# Altium footprint library my_lib.PcbLib: 121 footprints (part 7 of 8)
Each footprint in its own frame and in the unit in brackets; x right, y up, seen from the top. Pads: shape width x height; smd on the part's side, far side on the other; paste and mask are expansions set on the pad; w line width, h text height; cw(c..) or ccw(c..) is an arc to the next point about the centre after c.
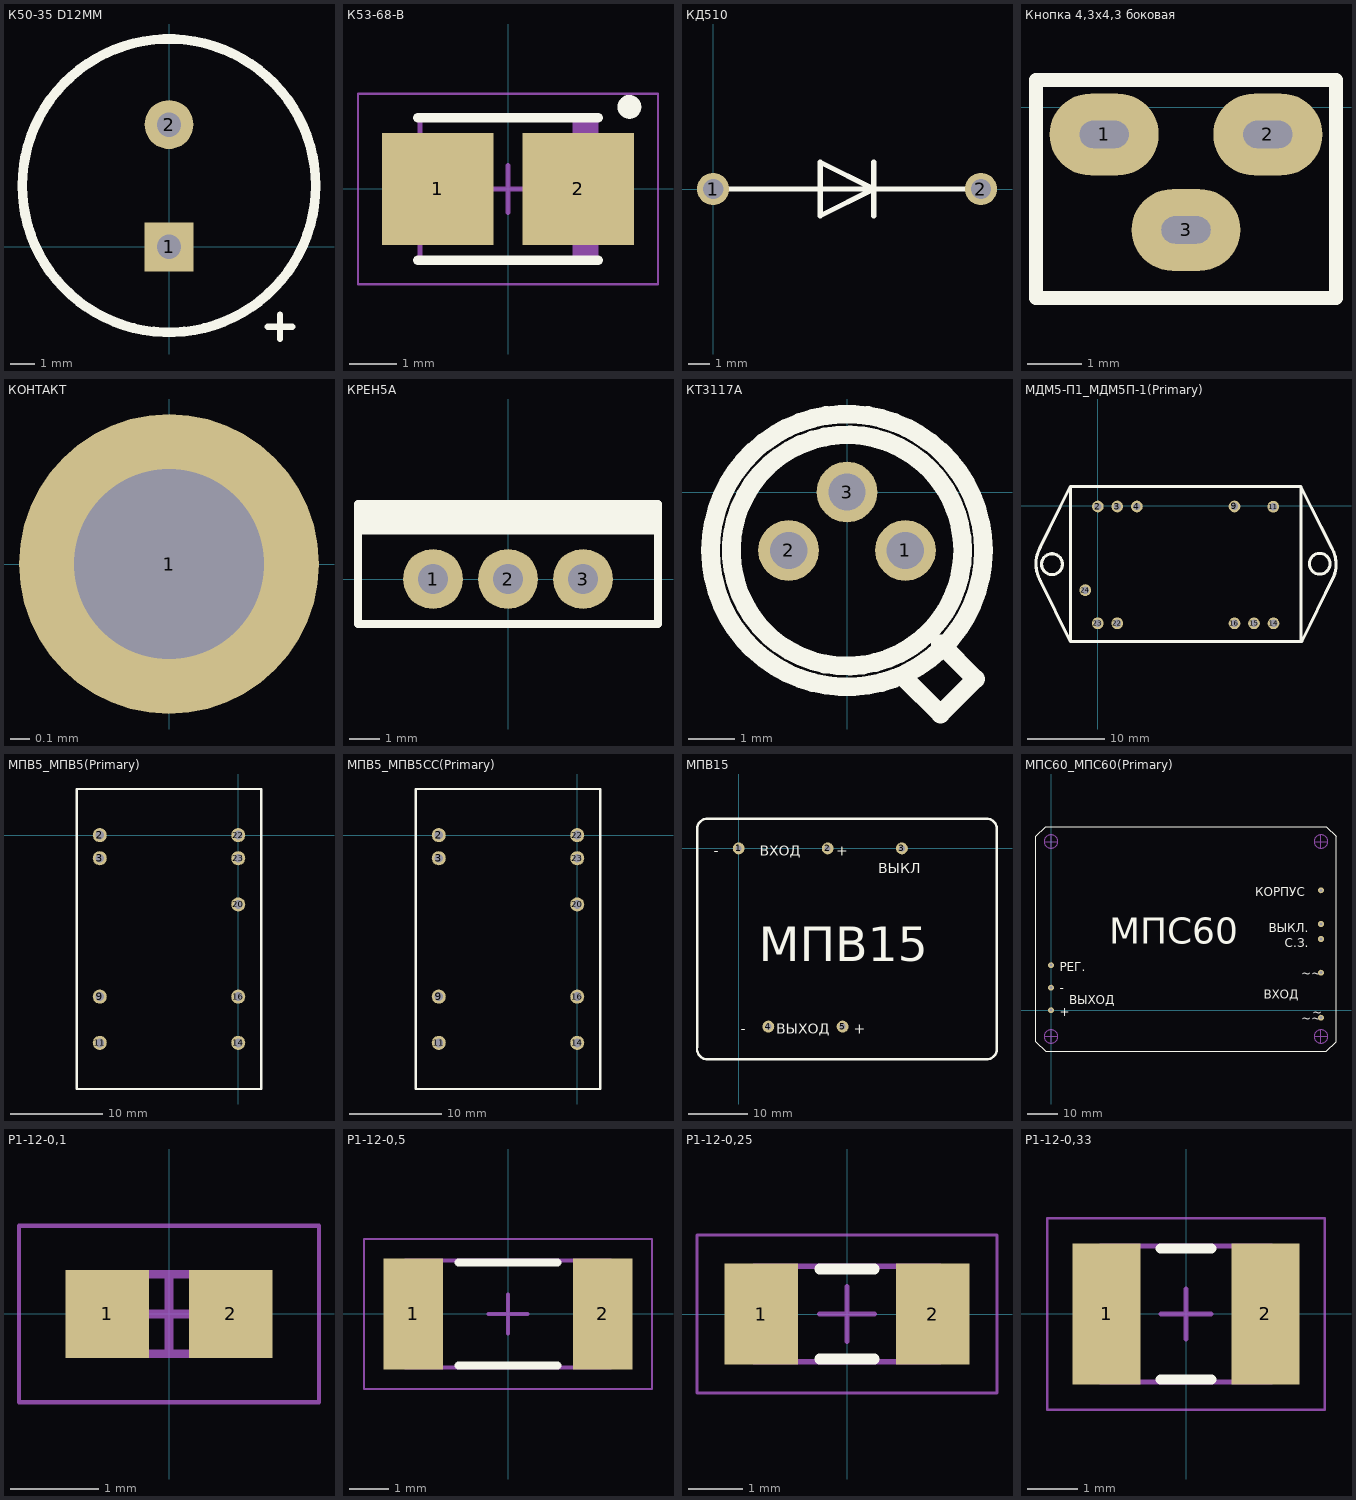
[diagram p6: the footprints below, top view; thin cyan lines are the x and y axes]

## К50-35 D12MM [mm]
pads (2):
  rect 2x2 hole 1: 1(0,0)
  round 2 hole 1: 2(0,5)
Top Overlay:
  lines w0.25: 4.04,-3.27 5.04,-3.27 ; 4.54,-3.77 4.54,-2.77
  lines w0.4: -6,2.5 ccw(c0,2.5) 6,2.5 ccw(c0,2.5) -6,2.5

## К53-68-B [mm] "Molded Capacitor, 2-Leads, Body 3,50x2,80mm, IPC Low Density"
height 2.1
pads (2):
  rect 2.35x2.35 smd: 1(-1.475,0) 2(1.475,0)
Top Overlay:
  circle w0.25: c2.55,1.725 r0.125
  lines w0.2: -1.9,-1.5 1.9,-1.5 ; -1.9,1.5 1.9,1.5
Mechanical 13:
  rectangle: 1.352,-1.5 1.85,1.5
  lines w0.1: -1.85,-1.5 1.85,-1.5 1.85,1.5 -1.85,1.5 -1.85,-1.5
Mechanical 15:
  lines w0.05: -3.15,-2 3.15,-2 3.15,2 -3.15,2 -3.15,-2
  lines w0.1: -0.5,0 0.5,0 ; 0,-0.5 0,0.5
3D body: height 2.1, standoff 0, extent -1.85,-1.5 1.85,1.5

## КД510 [mil]
pads (2):
  round 60 hole 38: 1(0,0) 2(500,0)
Top Overlay:
  lines w10: 0,0 500,0 ; 300,-50 300,50 ; 200,-50 300,0 200,50 200,-50

## Кнопка 4,3х4,3 боковая [mm]
pads (3):
  oval 2x1.5 hole 0.5 slot 0.9 at 0 deg: 1(2,-0.5) 2(5,-0.5) 3(3.5,-2.25)
Top Overlay:
  lines w0.254: 0.75,-3.5 6.25,-3.5 6.25,0.5 0.75,0.5 0.75,-3.5
3D body "E-type 3-Pin 4.5x4.5 Tact Switch TS45HE.STEP": height 4.75, standoff -1.75, extent 1.25,-4.5 5.75,0.5

## КОНТАКТ [mil]
pads (1):
  round 60 hole 38: 1(0,0)

## КРЕН5А [mm]
pads (3):
  round 2 hole 1: 1(-2.5,0) 2(0,0) 3(2.5,0)
Top Overlay:
  region: -5,2.5 -5,1.5 5,1.5 5,2.5
  lines w0.254: -5,-1.5 -5,2.5 5,2.5 5,-1.5 -5,-1.5

## КТ3117А [mm]
pads (3):
  round 1.3 hole 0.8: 1(1.25,-1.25) 2(-1.25,-1.25) 3(0,0)
Top Overlay:
  circle w0.4: c0,-1.25 r2.475
  circle w0.4: c0,-1.25 r2.92
  lines w0.4: 1.25,-4 2,-4.75 2.75,-4 2,-3.25

## МДМ5-П1_МДМ5П-1(Primary) [mil]
pads (11):
  round 60 hole 38: 2(-0.79,-2.76) 3(98.82,-2.76) 4(199.21,-2.76) 9(698.82,-2.36) 11(897.64,-3.54) 14(898.82,-600.79) 15(798.82,-600.79) 16(698.82,-600.79) 22(98.82,-600.79) 23(-1.18,-600.79) 24(-64.96,-430.71)
Top Overlay:
  lines w15.75: -298.82,-219.29 -141.73,100.79 ; -295.67,-381.5 -141.73,-693.7 ; -295.67,-212.99 ccw(c-143.63,-297.23) -294.09,-384.25 ; -288.78,-298.03 ccw(c-235.63,-298.03) -182.48,-298.03 ; -288.78,-297.64 cw(c-235.63,-297.64) -182.48,-297.64 ; -141.73,-694.49 -141.73,100.79 ; -141.34,-694.49 1039.37,-694.49 ; 1038.58,98.82 1195.28,-212.2 ; 1038.98,-694.88 1038.98,100.39 ; 1039.37,100.79 -141.73,100.79 ; 1043.31,-694.88 1203.54,-367.72 ; 1082.09,-296.06 ccw(c1135.24,-296.06) 1188.39,-296.06 ; 1082.09,-295.67 cw(c1135.24,-295.67) 1188.39,-295.67 ; 1195.28,-211.02 cw(c1044.81,-298.04) 1196.85,-382.28

## МПВ5_МПВ5(Primary) [mil]
pads (9):
  round 60 hole 38: 2(-590.55,0) 3(-590.55,-98.43) 9(-590.55,-688.98) 11(-590.55,-885.83) 14(0,-885.83) 16(0,-688.98) 20(0,-295.28) 22(0,0) 23(0,-98.43)
Top Overlay:
  lines w10: -688.98,-1082.68 -688.98,196.85 98.43,196.85 98.43,-1082.68 -688.98,-1082.68

## МПВ5_МПВ5СС(Primary) [mil]
pads (9):
  round 60 hole 38: 2(-590.55,0) 3(-590.55,-98.43) 9(-590.55,-688.98) 11(-590.55,-885.83) 14(0,-885.83) 16(0,-688.98) 20(0,-295.28) 22(0,0) 23(0,-98.43)
Top Overlay:
  lines w10: -688.98,-1082.68 -688.98,196.85 98.43,196.85 98.43,-1082.68 -688.98,-1082.68

## МПВ15 [mm]
pads (5):
  round 2 hole 1: 1(0,0) 2(15,0) 3(27.5,0) 4(5,-30) 5(17.5,-30)
Top Overlay:
  lines w0.4: -7.007,3.444 cw(c-5.25,3.25) -5.001,5 ; -7,-33.501 ccw(c-5.25,-33.75) -5.444,-35.507 ; -7,-33.5 -7,3.5 ; -5.5,-35.5 42,-35.5 ; -5,5 42,5 ; 41.501,-35.5 ccw(c41.75,-33.75) 43.507,-33.944 ; 41.944,5.007 cw(c41.75,3.25) 43.5,3.001 ; 43.5,-34 43.5,3.5
  text "-" at 0.322,-31.781 h3
  text "-" at -4.178,-1.781 h3
  text "+" at 19.425,-31.781 h3
  text "ВЫХОД" at 6.324,-31.781 h3
  text "+" at 16.425,-1.781 h3
  text "ВХОД" at 3.515,-1.781 h3
  text "ВЫКЛ" at 23.515,-4.781 h3
  text "МПВ15" at 3.378,-20.938 h10

## МПС60_МПС60(Primary) [mm]
pads (8):
  round 2 hole 1: 0(0,0) 1(0,7.5) 2(0,15) 3(90,-2.5) 4(90,12.5) 5(90,28.75) 6(90,23.75) 7(90,40)
Top Overlay:
  lines w0.4: -5,-10.5 -5,58 -1.75,61.25 91.75,61.25 95,58 95,-10.5 91.75,-13.75 -1.75,-13.75 -5,-10.5
  text "МПС60" at 19.473,19.094 h15
  text "ВЫКЛ." at 72.58,25.068 h4.94
  text "КОРПУС" at 68.082,37.068 h4.94
  text "ВХОД" at 70.903,2.818 h4.94
  text "ВЫХОД" at 6,1.068 h4.94
  text "С.З." at 77.872,20.068 h4.94
  text "~~" at 83.428,-4.932 h4.94
  text "~~" at 83.428,10.068 h4.94
  text "РЕГ." at 3,12.068 h4.94
  text "~" at 87,-2.963 h4.94
  text "-" at 3,5.068 h4.94
  text "+" at 3,-2.932 h4.94
Mechanical 1:
  lines w0.4: 0,-11 0,-6.5 ; 0,54 0,58.5 ; 90,-11 90,-6.5 ; 90,54 90,58.5 ; -2.25,-8.75 cw(c0,-8.75) 2.25,-8.75 ; -2.25,-8.75 ccw(c0,-8.75) 2.25,-8.75 ; -2.25,-8.75 2.25,-8.75 ; -2.25,56.25 cw(c0,56.25) 2.25,56.25 ; -2.25,56.25 ccw(c0,56.25) 2.25,56.25 ; -2.25,56.25 2.25,56.25 ; 87.75,-8.75 cw(c90,-8.75) 92.25,-8.75 ; 87.75,-8.75 ccw(c90,-8.75) 92.25,-8.75 ; 87.75,-8.75 92.25,-8.75 ; 87.75,56.25 cw(c90,56.25) 92.25,56.25 ; 87.75,56.25 ccw(c90,56.25) 92.25,56.25 ; 87.75,56.25 92.25,56.25

## Р1-12-0,1 [mm] "Chip Resistor, 2-Leads, Body 1,60x0,80mm, IPC Low Density"
height 0.55
pads (2):
  rect 0.95x1 smd: 1(-0.7,0) 2(0.7,0)
Mechanical 13:
  lines w0.1: -0.875,-0.45 0.875,-0.45 0.875,0.45 -0.875,0.45 -0.875,-0.45
Mechanical 15:
  lines w0.05: -1.7,-1 1.7,-1 1.7,1 -1.7,1 -1.7,-1
  lines w0.1: -0.45,0 0.45,0 ; 0,-0.45 0,0.45
3D body: height 0.55, standoff 0, extent 0.575,-0.45 0.875,0.45
3D body: height 0.55, standoff 0, extent -0.875,-0.45 -0.575,0.45
3D body: height 0.55, standoff 0, extent -0.575,-0.45 0.575,0.45

## Р1-12-0,5 [mm] "Chip Resistor, 2-Leads, Body 5,00x2,50mm, IPC Low Density"
height 0.8
pads (2):
  rect 1.5x2.8 smd: 1(-2.4,0) 2(2.4,0)
Top Overlay:
  lines w0.2: -1.25,-1.3 1.25,-1.3 ; -1.25,1.3 1.25,1.3
Mechanical 13:
  lines w0.1: -2.6,-1.35 -2.6,1.35 2.6,1.35 2.6,-1.35 -2.6,-1.35
Mechanical 15:
  lines w0.05: -3.65,-1.9 -3.65,1.9 3.65,1.9 3.65,-1.9 -3.65,-1.9
  lines w0.1: -0.5,0 0.5,0 ; 0,-0.5 0,0.5
3D body: height 0.8, standoff 0, extent -2.1,-1.35 2.1,1.35
3D body: height 0.8, standoff 0, extent -2.6,-1.35 -2.1,1.35
3D body: height 0.8, standoff 0, extent 2.1,-1.35 2.6,1.35

## Р1-12-0,25 [mm] "Chip Resistor, 2-Leads, Body 3,20x1,60mm, IPC Low Density"
height 0.8
pads (2):
  rect 1.35x1.85 smd: 1(-1.575,0) 2(1.575,0)
Top Overlay:
  lines w0.2: -0.5,-0.825 0.5,-0.825 ; -0.5,0.825 0.5,0.825
Mechanical 13:
  lines w0.1: -1.7,-0.875 -1.7,0.875 1.7,0.875 1.7,-0.875 -1.7,-0.875
Mechanical 15:
  lines w0.05: -2.75,-1.45 -2.75,1.45 2.75,1.45 2.75,-1.45 -2.75,-1.45
  lines w0.1: -0.5,0 0.5,0 ; 0,-0.5 0,0.5
3D body: height 0.8, standoff 0, extent -1.3,-0.875 1.3,0.875
3D body: height 0.8, standoff 0, extent -1.7,-0.875 -1.3,0.875
3D body: height 0.8, standoff 0, extent 1.3,-0.875 1.7,0.875

## Р1-12-0,33 [mm] "Chip Resistor, 2-Leads, Body 3,20x2,45mm, IPC Low Density"
height 0.8
pads (2):
  rect 1.35x2.8 smd: 1(-1.575,0) 2(1.575,0)
Top Overlay:
  lines w0.2: -0.5,-1.3 0.5,-1.3 ; -0.5,1.3 0.5,1.3
Mechanical 13:
  lines w0.1: -1.7,-1.35 -1.7,1.35 1.7,1.35 1.7,-1.35 -1.7,-1.35
Mechanical 15:
  lines w0.05: -2.75,-1.9 -2.75,1.9 2.75,1.9 2.75,-1.9 -2.75,-1.9
  lines w0.1: -0.5,0 0.5,0 ; 0,-0.5 0,0.5
3D body: height 0.8, standoff 0, extent -1.3,-1.35 1.3,1.35
3D body: height 0.8, standoff 0, extent -1.7,-1.35 -1.3,1.35
3D body: height 0.8, standoff 0, extent 1.3,-1.35 1.7,1.35